# Altium footprint library PCB_Lib_Devzone.PcbLib: 491 footprints (part 28 of 31)
Each footprint in its own frame and in the unit in brackets; x right, y up, seen from the top. Pads: shape width x height; smd on the part's side, far side on the other; paste and mask are expansions set on the pad; w line width, h text height; cw(c..) or ccw(c..) is an arc to the next point about the centre after c.
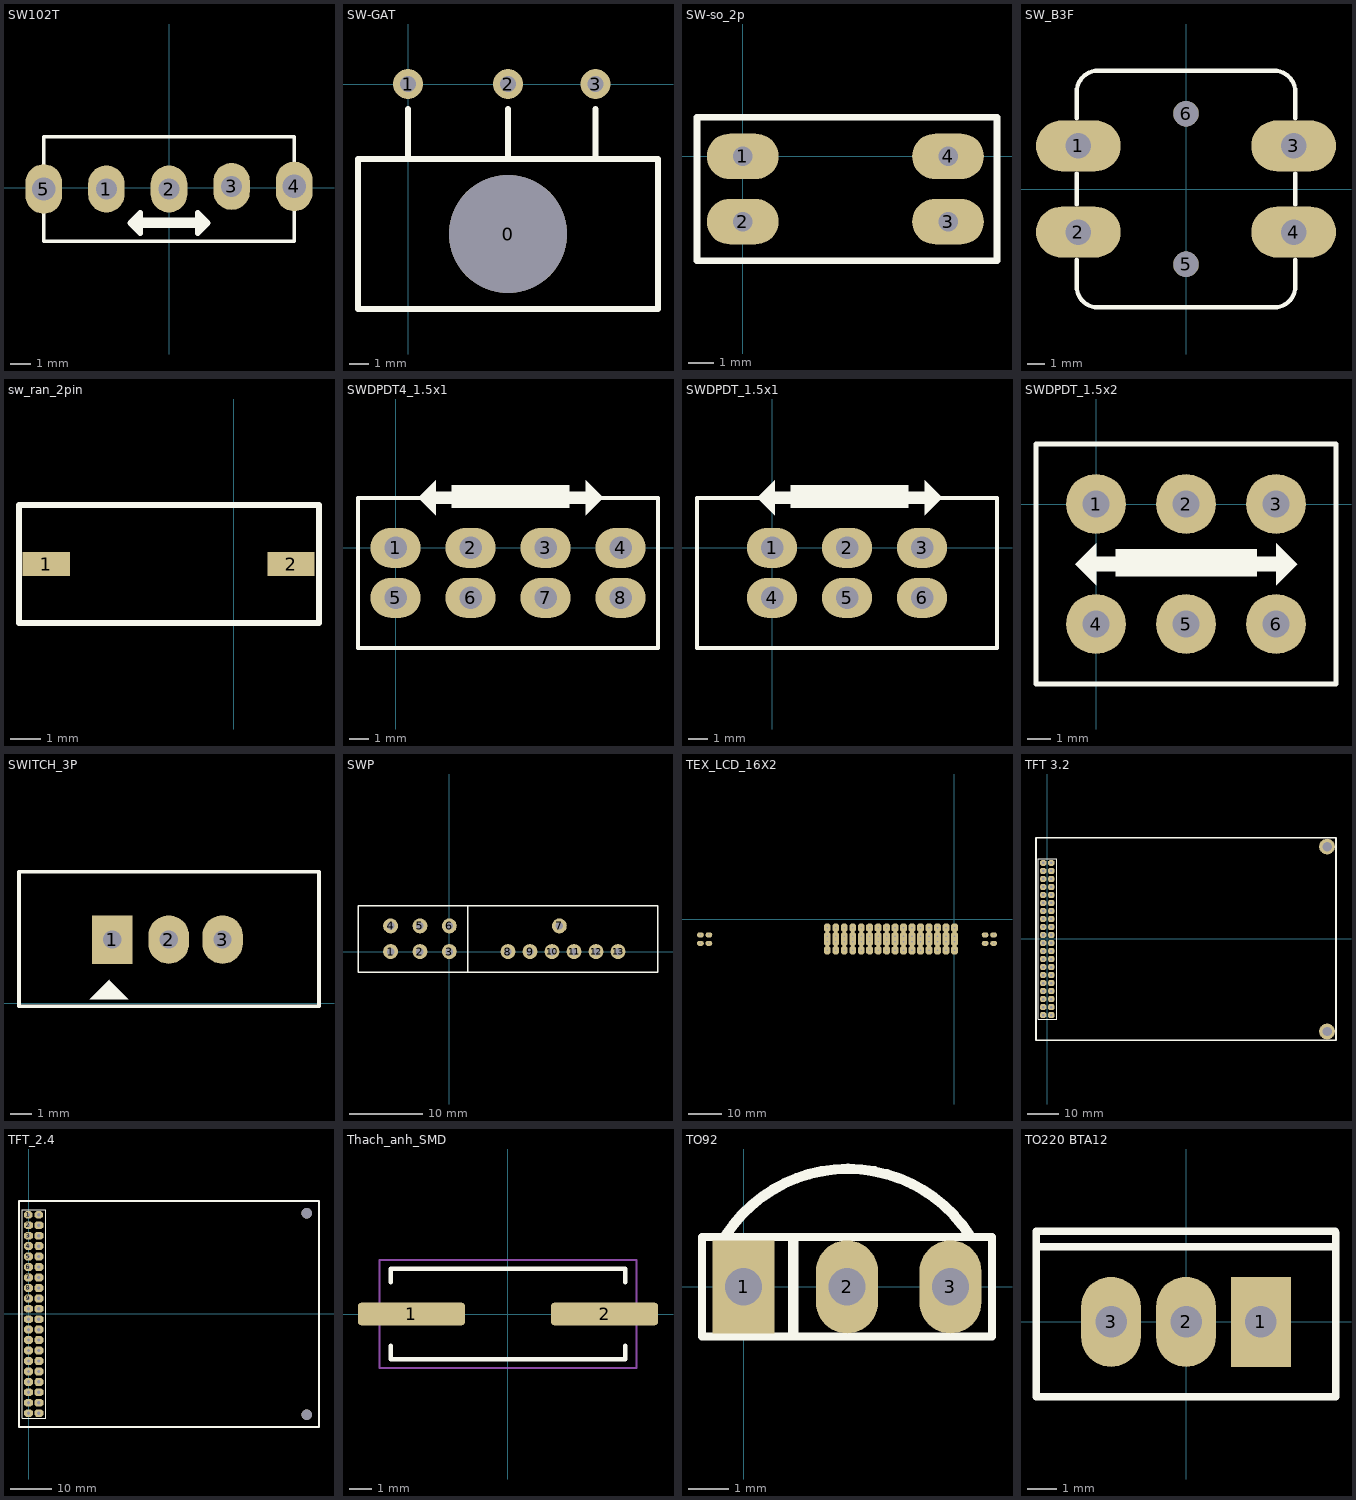
[diagram p27: the footprints below, top view; thin cyan lines are the x and y axes]

## SW102T [mil] "Switch 102 On Board To"
height 2
pads (5):
  oval 70x90 hole 40: 1(-120,-2.5) 2(0,-2.5) 3(120,2.5)
  oval 70x95 hole 45: 4(240,2.5) 5(-240,-2.5)
Top Overlay:
  lines w7: -240,-50 -240,-102.5 240,-102.5 240,-45 ; -240,45 -240,97.5 240,97.5 240,45
  lines w10: -75,-67.5 -55,-87.5 -55,-47.5 -75,-67.5 ; 55,-87.5 75,-67.5 55,-47.5 55,-87.5
  lines w20: -65,-67.5 65,-67.5

## SW-GAT [mil]
pads (4):
  round 236.22 hole 236.22: 0(200,-300)
  round 60 hole 31.5: 1(0,0) 2(200,0) 3(375,0)
Top Overlay:
  lines w12: 0,-150 0,-50 ; 200,-150 200,-50 ; 375,-150 375,-50 ; -100,-450 -100,-150 500,-150 500,-450 -100,-450

## SW-so_2p [mil]
pads (4):
  oval 110x70 hole 30: 1(0,0) 2(0,-100) 3(314.96,-100) 4(314.96,0)
Top Overlay:
  lines w10: -70,-160 -70,60 390,60 390,50 390,-160 360,-160 -70,-160

## SW_B3F [mm]
pads (6):
  oval 5x3 hole 1.5: 1(-6.35,2.54) 2(-6.35,-2.54) 3(6.35,2.54) 4(6.35,-2.54)
  round 1.5 hole 1.5: 5(0,-4.445) 6(0,4.445)
Top Overlay:
  lines w0.254: -6.452,-4.166 -6.452,-5.283 -6.452,-5.74 ccw(c-5.207,-5.74) -5.207,-6.985 -3.843,-6.985 5.207,-6.985 ccw(c5.207,-5.74) 6.452,-5.74 6.452,-4.166 ; -6.452,-0.914 -6.452,0.914 ; -6.452,4.166 -6.452,5.512 -6.452,5.715 cw(c-5.182,5.715) -5.182,6.985 -3.857,6.985 5.182,6.985 cw(c5.182,5.715) 6.452,5.715 6.452,4.166 ; 6.452,-0.914 6.452,0.914
3D body "User Library-omron_b3f4050.STEP": height 7.3, standoff -1.6, extent -5.944,-5.944 6.056,6.056

## sw_ran_2pin [mil]
pads (2):
  rect 61.02x31.5 smd: 1(-242,-266) 2(74,-266)
Top Overlay:
  lines w7.87: -277,-342 110,-342 110,-190 -188,-190 -277,-190 -277,-342
3D body "User Library-Tact switch 1181_3.STEP": height 99.49, standoff 1.06, extent -243.48,-336.86 71.49,-195.12

## SWDPDT4_1.5x1 [mil] "Switch 3 DPDT, Pin to Pin 150mil, Row to Row 100mil"
pads (8):
  oval 100x80 hole 45: 1(0,0) 2(150,0) 3(300,0) 4(450,0) 5(0,-100) 6(150,-100) 7(300,-100) 8(450,-100)
Top Overlay:
  region: 112.5,125 347.5,125 347.5,80 112.5,80
  region: 380,135 380,65 415,100
  region: 80,135 80,65 45,100
  lines w8: -75,-200 -75,100 525,100 525,-200 -75,-200
  lines w25: 75,100 125,100 ; 335,100 385,100

## SWDPDT_1.5x1 [mil] "Switch DPDT, Pin to Pin 150mil, Row to Row 100mil"
pads (6):
  oval 100x80 hole 45: 1(0,0) 2(150,0) 3(300,0) 4(0,-100) 5(150,-100) 6(300,-100)
Top Overlay:
  region: 5,135 5,65 -30,100
  region: 305,135 305,65 340,100
  region: 37.5,125 272.5,125 272.5,80 37.5,80
  lines w8: -150,-200 450,-200 450,100 -150,100 -150,-200
  lines w25: 0,100 50,100 ; 260,100 310,100

## SWDPDT_1.5x2 [mil] "Switch DPDT, Pin to Pin 150mil, Row to Row 200mil"
pads (6):
  round 100 hole 45: 1(0,0) 2(150,0) 3(300,0) 4(0,-200) 5(150,-200) 6(300,-200)
Top Overlay:
  region: 32.5,-75 267.5,-75 267.5,-120 32.5,-120
  region: 300,-65 300,-135 335,-100
  region: 0,-65 0,-135 -35,-100
  lines w8: -100,-300 -100,100 400,100 400,-300 -100,-300
  lines w25: -5,-100 45,-100 ; 255,-100 305,-100

## SWITCH_3P [mil]
pads (3):
  rect 75x90 hole 34: 1(-541,118)
  oval 75x90 hole 34: 2(-436,118) 3(-336,118)
Top Overlay:
  region: -582.5,7 -511.5,7 -546.5,42 -546.5,43
  lines w7: -714,-6 -714,244 -157,244 -157,111 -157,-6 -714,-6
3D body "User Library-SLB12814.STEP": height 379.92, standoff -102.36, extent -711.58,-4.04 -160.4,240.06

## SWP [mil] "SW Power"
height 100
pads (13):
  round 80 hole 40: 1(-314.96,0) 2(-157.48,0) 3(0,0) 4(-314.96,137.8) 5(-157.48,137.8) 6(0,137.8) 7(590.55,137.8) 8(314.96,0) 9(433.07,0) 10(551.18,0) 11(669.29,0) 12(787.4,0) 13(905.51,0)
Top Overlay:
  lines w8: 100,-109.33 100,245 ; -490,-110 -490,245 1120,245 1120,-110 -490,-110

## TEX_LCD_16X2 [mil]
pads (72):
  oct 80x100 hole 20: 1(0,-367) 1(0,-267) 1(0,-200) 1(0,-100) 2(-100,-367) 2(-100,-267) 2(-100,-200) 2(-100,-100) 3(-200,-367) 3(-200,-267) 3(-200,-200) 3(-200,-100) 4(-300,-367) 4(-300,-267) 4(-300,-200) 4(-300,-100) 5(-400,-367) 5(-400,-267) 5(-400,-200) 5(-400,-100) 6(-500,-367) 6(-500,-267) 6(-500,-200) 6(-500,-100) 7(-600,-367) 7(-600,-267) 7(-600,-200) 7(-600,-100) 8(-700,-367) 8(-700,-267) 8(-700,-200) 8(-700,-100) 9(-800,-367) 9(-800,-267) 9(-800,-200) 9(-800,-100) 10(-900,-367) 10(-900,-267) 10(-900,-200) 10(-900,-100) 11(-1000,-367) 11(-1000,-267) 11(-1000,-200) 11(-1000,-100) 12(-1100,-367) 12(-1100,-267) 12(-1100,-200) 12(-1100,-100) 13(-1200,-367) 13(-1200,-267) 13(-1200,-200) 13(-1200,-100) 14(-1300,-367) 14(-1300,-267) 14(-1300,-200) 14(-1300,-100) 15(-1400,-367) 15(-1400,-267) 15(-1400,-200) 15(-1400,-100) 16(-1500,-367) 16(-1500,-267) 16(-1500,-200) 16(-1500,-100)
  oval 80x60 hole 20: ""(-2996,-285) ""(-2996,-185) ""(-2896,-285) ""(-2896,-185) ""(362,-285) ""(362,-185) ""(462,-285) ""(462,-185)
3D body "User Library-LCD 16x2 WC1602A0-SFYLNC06.STEP": height 1458.66, standoff 41.34, extent -2847,-609.94 312.45,-102.06
3D body "female_header_a-bl254-da-g04d.stp": height 198.43, standoff -124.41, extent -156.92,-751.65 52.92,-255.58
3D body "female_header_a-bl254-da-g04d.stp": height 198.43, standoff -124.41, extent -355.92,-751.64 -146.08,-255.58
3D body "female_header_a-bl254-da-g04d.stp": height 198.43, standoff -124.41, extent -554.92,-751.64 -345.08,-255.58
3D body "female_header_a-bl254-da-g04d.stp": height 198.43, standoff -124.41, extent -755.92,-751.65 -546.08,-255.58
3D body "female_header_a-bl254-da-g04d.stp": height 198.43, standoff -124.41, extent -953.92,-751.65 -744.08,-255.58
3D body "female_header_a-bl254-da-g04d.stp": height 198.43, standoff -124.41, extent -1148.92,-751.65 -939.08,-255.58
3D body "female_header_a-bl254-da-g04d.stp": height 198.43, standoff -124.41, extent -1347.92,-751.65 -1138.08,-255.58
3D body "female_header_a-bl254-da-g04d.stp": height 198.43, standoff -124.41, extent -1551.92,-751.64 -1342.08,-255.58
3D body "female_header_a-bl254-da-g04d.stp": height 198.43, standoff -124.41, extent -155.84,-211.03 54,285.03
3D body "female_header_a-bl254-da-g04d.stp": height 198.43, standoff -124.41, extent -354.92,-209.41 -145.07,286.65
3D body "female_header_a-bl254-da-g04d.stp": height 198.43, standoff -124.41, extent -553.92,-208.41 -344.07,287.65
3D body "female_header_a-bl254-da-g04d.stp": height 198.43, standoff -124.41, extent -754.92,-208.41 -545.07,287.65
3D body "female_header_a-bl254-da-g04d.stp": height 198.43, standoff -124.41, extent -950.92,-208.06 -741.08,288
3D body "female_header_a-bl254-da-g04d.stp": height 198.43, standoff -124.41, extent -1151.84,-208.03 -942,288.03
3D body "female_header_a-bl254-da-g04d.stp": height 198.43, standoff -124.41, extent -1349.92,-208.06 -1140.08,288
3D body "female_header_a-bl254-da-g04d.stp": height 198.43, standoff -124.41, extent -1557.91,-208.41 -1348.07,287.65
3D body "female_header_a-bl254-dg-g04d.stp": height 334.65, standoff -125.98, extent 313.57,-338.92 510.42,-129.07
3D body "female_header_a-bl254-dg-g04d.stp": height 334.65, standoff -125.98, extent -3044.43,-338.92 -2847.58,-129.07

## TFT 3.2 [mil]
pads (42):
  oct 80x75 hole 31.5: 1(-50,949) 40(50,949)
  oct 85x75 hole 31.5: 2(-50,849) 3(-50,749) 4(-50,649) 5(-50,549) 6(-50,449) 7(-50,349) 8(-50,249) 9(-50,149) 10(-50,49) 11(-50,-51) 12(-50,-151) 13(-50,-251) 14(-50,-351) 15(-50,-451) 16(-50,-551) 17(-50,-651) 18(-50,-751) 19(-50,-851) 20(-50,-951) 21(50,-951) 22(50,-851) 23(50,-751) 24(50,-651) 25(50,-551) 26(50,-451) 27(50,-351) 28(50,-251) 29(50,-151) 30(50,-51) 31(50,49) 32(50,149) 33(50,249) 34(50,349) 35(50,449) 36(50,549) 37(50,649) 38(50,749) 39(50,849)
  round 196.85 hole 118.11: ""(3491,-1155) ""(3491,1152)
Top Overlay:
  lines w7.87: -25,999 116,999 116,-1001 -109,-1001 -109,999 25,999
  lines w20: -140,1262 -140,1069 -140,1049 -140,-1265.94 3602.36,-1265.94 ; -140,1263.98 3603,1263.98 3603,-1265.94

## TFT_2.4 [mil]
pads (42):
  oct 80x75 hole 31.5: 1(-2,948) 40(98,948)
  oct 85x75 hole 31.5: 2(-2,848) 3(-2,748) 4(-2,648) 5(-2,548) 6(-2,448) 7(-2,348) 8(-2,248) 9(-2,148) 10(-2,48) 11(-2,-52) 12(-2,-152) 13(-2,-252) 14(-2,-352) 15(-2,-452) 16(-2,-552) 17(-2,-652) 18(-2,-752) 19(-2,-852) 20(-2,-952) 21(98,-952) 22(98,-852) 23(98,-752) 24(98,-652) 25(98,-552) 26(98,-452) 27(98,-352) 28(98,-252) 29(98,-152) 30(98,-52) 31(98,48) 32(98,148) 33(98,248) 34(98,348) 35(98,448) 36(98,548) 37(98,648) 38(98,748) 39(98,848)
  round 100 hole 100: ""(2664,-966) ""(2664,963)
Top Overlay:
  lines w7.87: 23,998 164,998 164,-1002 -61,-1002 -61,998 73,998
  lines w20: -92,-1085 2782,-1085 2782,1081 -54,1081 -92,1081 -92,1068 -92,1048 -92,-1085

## Thach_anh_SMD [mm]
pads (2):
  rrect25% 4.744x1 smd: 1(-4.286,0) 2(4.286,0)
Top Overlay:
  lines w0.2: -5.2,-1.4 -5.2,-2 5.2,-2 5.2,-1.4 ; -5.2,1.4 -5.2,2 5.2,2 5.2,1.4
Mechanical 1:
  lines w0.1: -5.7,-2.4 5.7,-2.4 5.7,2.4 -5.7,2.4 -5.7,-2.4
3D body: height 1.25, standoff 0.1, extent -3.258,-2.15 3.259,2.15
3D body: height 1.25, standoff 0.1, extent 1.117,-2.141 5.4,2.15
3D body: height 1.25, standoff 0.1, extent -5.4,-2.15 -1.117,2.142
3D body: height 4.3, standoff 0.1, extent -3.257,-1.9 3.258,1.9
3D body: height 4.3, standoff 0.1, extent 1.365,-1.892 5.15,1.9
3D body: height 4.3, standoff 0.1, extent -5.15,-1.9 -1.365,1.893
3D body: height 0.25, standoff 0, extent 2.2,-0.3 6.6,0.3
3D body: height 0.25, standoff 0, extent -6.6,-0.3 -2.2,0.3
3D body: height 0.75, standoff 0.01, extent -5.7,-2.4 5.7,2.4

## TO92 [mil]
pads (3):
  rect 60x90 hole 36: 1(0,0)
  oval 60x90 hole 36: 2(100,0) 3(200,0)
Top Overlay:
  lines w7.87: -40,-48 -40,48 240,48 240,-48 -40,-48
  lines w10: -17,50 cw(c100.72,-26.27) 218.71,49.58 ; 48,-47 48,47
3D body "SW3dPS-TO92.STEP": height 335.04, standoff -109.79, extent -7.87,-61.05 209.86,99.51

## TO220 BTA12 [mil]
pads (3):
  rect 80x120 hole 42: 1(100,0)
  oval 80x120 hole 42: 2(0,0) 3(-100,0)
Top Overlay:
  lines w10: -200,-100 198,-100 ; -200,-98 -200,100 ; 199,121 -200,121 -200,100 ; 200,-100 200,100 -200,100 ; 200,98 200,119